# Altium footprint library Connectors.PcbLib: 97 footprints (part 5 of 7)
Each footprint in its own frame and in the unit in brackets; x right, y up, seen from the top. Pads: shape width x height; smd on the part's side, far side on the other; paste and mask are expansions set on the pad; w line width, h text height; cw(c..) or ccw(c..) is an arc to the next point about the centre after c.
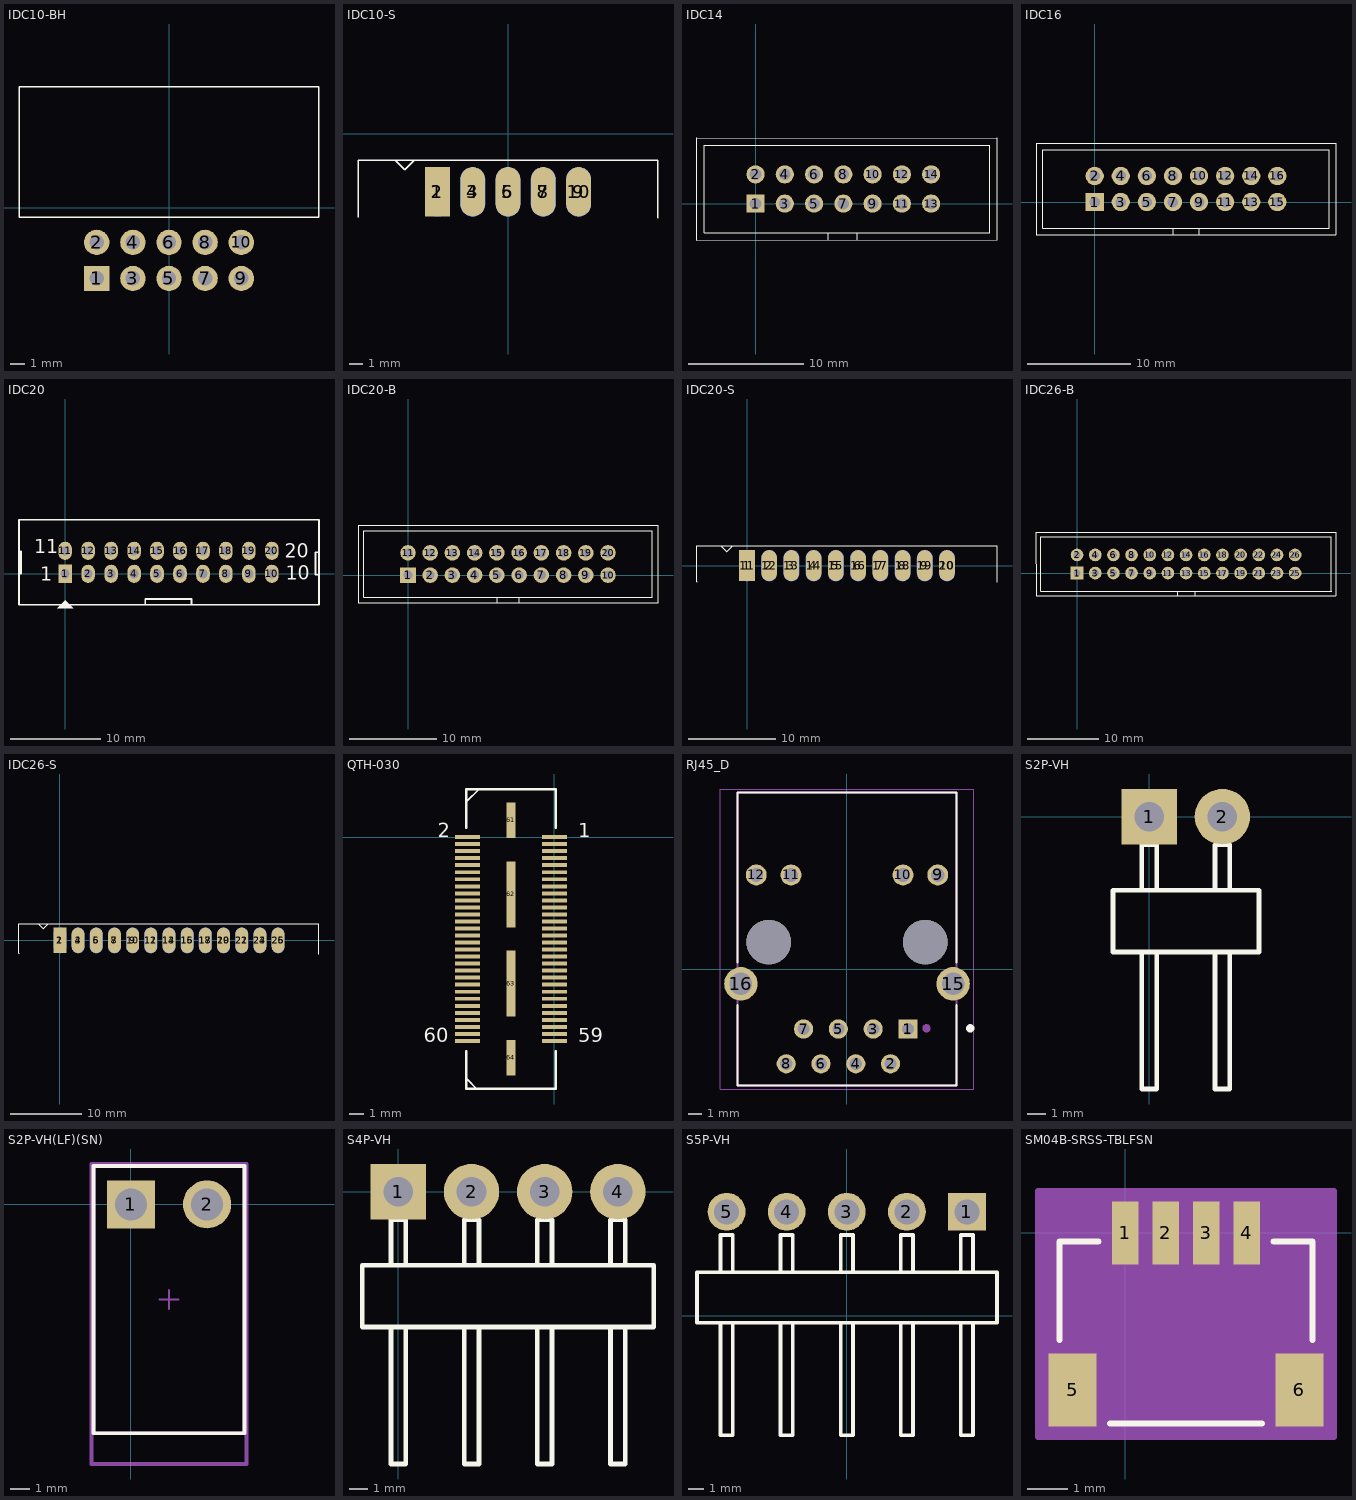
[diagram p4: the footprints below, top view; thin cyan lines are the x and y axes]

## IDC10-BH [mil]
pads (10):
  rect 70x70 hole 40: 1(-200,-195)
  round 70 hole 40: 2(-200,-95) 3(-100,-195) 4(-100,-95) 5(0,-195) 6(0,-95) 7(100,-195) 8(100,-95) 9(200,-195) 10(200,-95)
Top Overlay:
  lines w4: -415,-25 -415,335 415,335 415,-25 -415,-25
3D body "User Library-IDC Socket Male 10pin Angled THT Goldplated 2_54mm.step": height 353.54, standoff -93.31, extent -412.2,-203.86 412.2,330

## IDC10-S [mil]
pads (10):
  rect 70x140 smd: 1(-200,-165)
  oval 70x140 smd far side: 2(-200,-165) 4(-100,-165) 6(0,-165) 8(100,-165) 10(200,-165)
  oval 70x140 smd: 3(-100,-165) 5(0,-165) 7(100,-165) 9(200,-165)
Top Overlay:
  lines w4: -319,-75 -292,-102 -265,-75 ; -425,-237 -425,-75 425,-75 425,-239 ; -425,-237 -425,-237 ; 425,-239 425,-239
3D body: height 150, standoff -150, extent -424.5,-67.5 425,18
3D body: height 150, standoff 120, extent -425.5,-67.5 425.5,275.5
3D body: height 150, standoff -150, extent -424.5,-67.5 -386,276
3D body: height 150, standoff -150, extent -424.5,-67.5 425,18
3D body: height 150, standoff -150, extent 386.5,-67.5 425,276
3D body: height 150, standoff 120, extent -424.5,-67.5 425,276
3D body: height 30, standoff 10, extent 187.5,-237.5 212.5,236.5
3D body: height 30, standoff 10, extent 87.5,-237.5 112.5,236.5
3D body: height 30, standoff 10, extent -12.5,-237.5 12.5,236.5
3D body: height 30, standoff 10, extent -112.5,-237.5 -87.5,236.5
3D body: height 30, standoff 10, extent -212.5,-237.5 -187.5,236.5
3D body: height 30, standoff 10, extent -212.5,-237.5 -187.5,236.5
3D body: height 30, standoff 10, extent -112.5,-237.5 -87.5,236.5
3D body: height 30, standoff 10, extent -12.5,-237.5 12.5,236.5
3D body: height 30, standoff 10, extent 87.5,-237.5 112.5,236.5
3D body: height 30, standoff 10, extent 187.5,-237.5 212.5,236.5
3D body: height 151, standoff 150, extent -227.75,142 -175.25,257
3D body: height 150, standoff -150, extent 386.5,-67.5 425,276
3D body: height 150, standoff -150, extent -424.5,-67.5 -386,276

## IDC14 [mil]
pads (14):
  rect 62x62 hole 40: 1(0,0)
  round 62 hole 40: 2(0,100) 3(100,0) 4(100,100) 5(200,0) 6(200,100) 7(300,0) 8(300,100) 9(400,0) 10(400,100) 11(500,0) 12(500,100) 13(600,0) 14(600,100)
Top Overlay:
  lines w4: 248,-125 248,-100 ; 348,-125 348,-100 ; 824,224 -200,225 -200,-125 825,-124 ; 825,-125 825,225 ; -175,-100 -175,200 800,200 800,-100 300,-100 -175,-100
3D body: height 300, standoff -120, extent 587.5,87.5 612.5,112.5
3D body: height 300, standoff -120, extent 587.5,-12.5 612.5,12.5
3D body: height 300, standoff -120, extent 487.5,87.5 512.5,112.5
3D body: height 300, standoff -120, extent 487.5,-12.5 512.5,12.5
3D body: height 300, standoff -120, extent -12.5,-12.5 12.5,12.5
3D body: height 300, standoff -120, extent 87.5,-12.5 112.5,12.5
3D body: height 300, standoff -120, extent 187.5,-12.5 212.5,12.5
3D body: height 300, standoff -120, extent 287.5,-12.5 312.5,12.5
3D body: height 300, standoff -120, extent 387.5,-12.5 412.5,12.5
3D body: height 300, standoff -120, extent 387.5,87.5 412.5,112.5
3D body: height 300, standoff -120, extent 287.5,87.5 312.5,112.5
3D body: height 300, standoff -120, extent 187.5,87.5 212.5,112.5
3D body: height 300, standoff -120, extent 87.5,87.5 112.5,112.5
3D body: height 300, standoff -120, extent -12.5,87.5 12.5,112.5
3D body: height 102.36, standoff 0, extent -200.5,-125 825,225
3D body: height 358.27, standoff 0, extent -201.5,-125 824.5,225

## IDC16 [mil]
pads (16):
  rect 70x70 hole 40: 1(0,0)
  round 70 hole 40: 2(0,100) 3(100,0) 4(100,100) 5(200,0) 6(200,100) 7(300,0) 8(300,100) 9(400,0) 10(400,100) 11(500,0) 12(500,100) 13(600,0) 14(600,100) 15(700,0) 16(700,100)
Top Overlay:
  lines w4: 300,-125 300,-100 ; 400,-125 400,-100 ; -225,-125 -225,225 925,225 925,-125 -225,-125 ; -200,-100 900,-100 900,200 -200,200 -200,-100
3D body: height 300, standoff -120, extent 687.5,-12.5 712.5,12.5
3D body: height 300, standoff -120, extent 687.5,87.5 712.5,112.5
3D body: height 300, standoff -120, extent 587.5,87.5 612.5,112.5
3D body: height 300, standoff -120, extent 587.5,-12.5 612.5,12.5
3D body: height 300, standoff -120, extent 487.5,87.5 512.5,112.5
3D body: height 300, standoff -120, extent 487.5,-12.5 512.5,12.5
3D body: height 300, standoff -120, extent -12.5,-12.5 12.5,12.5
3D body: height 300, standoff -120, extent 87.5,-12.5 112.5,12.5
3D body: height 300, standoff -120, extent 187.5,-12.5 212.5,12.5
3D body: height 300, standoff -120, extent 287.5,-12.5 312.5,12.5
3D body: height 300, standoff -120, extent 387.5,-12.5 412.5,12.5
3D body: height 300, standoff -120, extent 387.5,87.5 412.5,112.5
3D body: height 300, standoff -120, extent 287.5,87.5 312.5,112.5
3D body: height 300, standoff -120, extent 187.5,87.5 212.5,112.5
3D body: height 300, standoff -120, extent 87.5,87.5 112.5,112.5
3D body: height 300, standoff -120, extent -12.5,87.5 12.5,112.5
3D body: height 102.36, standoff 0, extent -225,-125 924.5,225
3D body: height 358.27, standoff 0, extent -224.5,-125 925.5,225

## IDC20 [mm] "Header 10x2,20 pin, connecter"
height 7.62
pads (20):
  rect 1.5x2 hole 1: 1(0,0)
  oval 1.5x2 hole 1: 2(2.54,0) 3(5.08,0) 4(7.62,0) 5(10.16,0) 6(12.7,0) 7(15.24,0) 8(17.78,0) 9(20.32,0) 10(22.86,0) 11(0,2.54) 12(2.54,2.54) 13(5.08,2.54) 14(7.62,2.54) 15(10.16,2.54) 16(12.7,2.54) 17(15.24,2.54) 18(17.78,2.54) 19(20.32,2.54) 20(22.86,2.54)
Top Overlay:
  region: 0,-2.921 -0.889,-3.81 0.889,-3.81
  lines w0.178: -5.1,-0.025 -5.075,0 -4.875,0 -4.875,2.475 -5.1,2.475 ; 8.875,-3.394 8.875,-2.794 13.975,-2.794 13.975,-3.344 14.025,-3.394 ; 27.94,-0.127 27.686,-0.127 27.686,2.398 27.94,2.398 ; -5.1,-3.429 28.067,-3.429 28.067,5.969 -5.1,5.969 -5.1,-3.429
  text "20" at 24.257,1.778 h1.52
  text "10" at 24.384,-0.635 h1.52
  text "11" at -3.429,2.286 h1.52
  text "1" at -2.775,-0.75 h1.52
3D body "20 vuong.step": height 9.1, standoff -3, extent -5.094,-3.407 28.106,5.893

## IDC20-B [mil]
pads (20):
  rect 70x70 hole 40: 1(0,0)
  round 70 hole 40: 2(100,0) 3(200,0) 4(300,0) 5(400,0) 6(500,0) 7(600,0) 8(700,0) 9(800,0) 10(900,0) 11(0,100) 12(100,100) 13(200,100) 14(300,100) 15(400,100) 16(500,100) 17(600,100) 18(700,100) 19(800,100) 20(900,100)
Top Overlay:
  lines w4: 150,-100 1100,-100 1100,200 -200,200 -200,-100 250,-100 ; 400,-125 400,-100 ; 500,-125 500,-100 ; -225,-125 1125,-125 1125,225 -225,225 -225,-125
3D body: height 358.27, standoff 0, extent -224.5,-125 1125,225
3D body: height 102.36, standoff 0, extent -225,-125 1124.5,225
3D body: height 300, standoff -120, extent -12.5,87.5 12.5,112.5
3D body: height 300, standoff -120, extent 87.5,87.5 112.5,112.5
3D body: height 300, standoff -120, extent 187.5,87.5 212.5,112.5
3D body: height 300, standoff -120, extent 287.5,87.5 312.5,112.5
3D body: height 300, standoff -120, extent 387.5,87.5 412.5,112.5
3D body: height 300, standoff -120, extent 387.5,-12.5 412.5,12.5
3D body: height 300, standoff -120, extent 287.5,-12.5 312.5,12.5
3D body: height 300, standoff -120, extent 187.5,-12.5 212.5,12.5
3D body: height 300, standoff -120, extent 87.5,-12.5 112.5,12.5
3D body: height 300, standoff -120, extent -12.5,-12.5 12.5,12.5
3D body: height 300, standoff -120, extent 487.5,-12.5 512.5,12.5
3D body: height 300, standoff -120, extent 487.5,87.5 512.5,112.5
3D body: height 300, standoff -120, extent 587.5,-12.5 612.5,12.5
3D body: height 300, standoff -120, extent 587.5,87.5 612.5,112.5
3D body: height 300, standoff -120, extent 687.5,87.5 712.5,112.5
3D body: height 300, standoff -120, extent 687.5,-12.5 712.5,12.5
3D body: height 300, standoff -120, extent 787.5,-12.5 812.5,12.5
3D body: height 300, standoff -120, extent 787.5,87.5 812.5,112.5
3D body: height 300, standoff -120, extent 887.5,-12.5 912.5,12.5
3D body: height 300, standoff -120, extent 887.5,87.5 912.5,112.5

## IDC20-S [mil] "IDC20 EDGE SOLDERED"
pads (20):
  rect 70x140 smd: 1(0,0)
  oval 70x140 smd: 2(100,0) 3(200,0) 4(300,0) 5(400,0) 6(500,0) 7(600,0) 8(700,0) 9(800,0) 10(900,0)
  oval 70x140 smd far side: 11(0,0) 12(100,0) 13(200,0) 14(300,0) 15(400,0) 16(500,0) 17(600,0) 18(700,0) 19(800,0) 20(900,0)
Top Overlay:
  lines w4: -119,90 -92,63 -65,90 ; 1125,-75 1125,90 -225,90 -225,-72 ; -225,-72 -225,-72
3D body: height 30, standoff 10, extent 587.5,-72.5 612.5,401.5
3D body: height 30, standoff 10, extent 487.5,-72.5 512.5,401.5
3D body: height 30, standoff 10, extent 487.5,-72.5 512.5,401.5
3D body: height 30, standoff 10, extent 587.5,-72.5 612.5,401.5
3D body: height 150, standoff 120, extent -225.5,97.5 1125,440.5
3D body: height 150, standoff -150, extent -224.5,97.5 -186,441
3D body: height 150, standoff -150, extent -224.5,97.5 1125,183
3D body: height 150, standoff 120, extent -224.5,97.5 1125,441
3D body: height 30, standoff 10, extent 387.5,-72.5 412.5,401.5
3D body: height 30, standoff 10, extent 287.5,-72.5 312.5,401.5
3D body: height 30, standoff 10, extent 187.5,-72.5 212.5,401.5
3D body: height 30, standoff 10, extent 87.5,-72.5 112.5,401.5
3D body: height 30, standoff 10, extent -12.5,-72.5 12.5,401.5
3D body: height 30, standoff 10, extent -12.5,-72.5 12.5,401.5
3D body: height 30, standoff 10, extent 87.5,-72.5 112.5,401.5
3D body: height 30, standoff 10, extent 187.5,-72.5 212.5,401.5
3D body: height 30, standoff 10, extent 287.5,-72.5 312.5,401.5
3D body: height 30, standoff 10, extent 387.5,-72.5 412.5,401.5
3D body: height 151, standoff 150, extent -27.75,307 24.75,422
3D body: height 150, standoff -150, extent -224.5,97.5 -186,441
3D body: height 150, standoff -150, extent -224.5,97.5 1125,183
3D body: height 150, standoff -150, extent 1086.5,97.5 1125,441
3D body: height 30, standoff 10, extent 687.5,-72.5 712.5,401.5
3D body: height 30, standoff 10, extent 687.5,-72.5 712.5,401.5
3D body: height 150, standoff -150, extent 1086.5,97.5 1125,441
3D body: height 30, standoff 10, extent 887.5,-72.5 912.5,401.5
3D body: height 30, standoff 10, extent 787.5,-72.5 812.5,401.5
3D body: height 30, standoff 10, extent 787.5,-72.5 812.5,401.5
3D body: height 30, standoff 10, extent 887.5,-72.5 912.5,401.5

## IDC26-B [mil]
pads (26):
  rect 70x70 hole 40: 1(0,0)
  round 70 hole 40: 2(0,100) 3(100,0) 4(100,100) 5(200,0) 6(200,100) 7(300,0) 8(300,100) 9(400,0) 10(400,100) 11(500,0) 12(500,100) 13(600,0) 14(600,100) 15(700,0) 16(700,100) 17(800,0) 18(800,100) 19(900,0) 20(900,100) 21(1000,0) 22(1000,100) 23(1100,0) 24(1100,100) 25(1200,0) 26(1200,100)
Top Overlay:
  lines w4: 150,-100 1400.39,-100 ; 250,-100 -200,-100 -200,200 1399.41,200 ; 550.2,-125 550.2,-100 ; 650.2,-125 650.2,-100 ; 1400,-100 1400,200 ; 1424.41,-125 -225,-125 -225.98,225 1424.41,225 ; 1425,-125 1425,225
3D body: height 300, standoff -120, extent 887.5,87.5 912.5,112.5
3D body: height 300, standoff -120, extent 887.5,-12.5 912.5,12.5
3D body: height 300, standoff -120, extent 787.5,87.5 812.5,112.5
3D body: height 300, standoff -120, extent 787.5,-12.5 812.5,12.5
3D body: height 300, standoff -120, extent 687.5,-12.5 712.5,12.5
3D body: height 300, standoff -120, extent 687.5,87.5 712.5,112.5
3D body: height 300, standoff -120, extent 587.5,87.5 612.5,112.5
3D body: height 300, standoff -120, extent 587.5,-12.5 612.5,12.5
3D body: height 300, standoff -120, extent 487.5,87.5 512.5,112.5
3D body: height 300, standoff -120, extent 487.5,-12.5 512.5,12.5
3D body: height 300, standoff -120, extent -12.5,-12.5 12.5,12.5
3D body: height 300, standoff -120, extent 87.5,-12.5 112.5,12.5
3D body: height 300, standoff -120, extent 187.5,-12.5 212.5,12.5
3D body: height 300, standoff -120, extent 287.5,-12.5 312.5,12.5
3D body: height 300, standoff -120, extent 387.5,-12.5 412.5,12.5
3D body: height 300, standoff -120, extent 387.5,87.5 412.5,112.5
3D body: height 300, standoff -120, extent 287.5,87.5 312.5,112.5
3D body: height 300, standoff -120, extent 187.5,87.5 212.5,112.5
3D body: height 300, standoff -120, extent 87.5,87.5 112.5,112.5
3D body: height 300, standoff -120, extent -12.5,87.5 12.5,112.5
3D body: height 102.36, standoff 0, extent -225,-125 1425,225
3D body: height 358.27, standoff 0, extent -224.5,-125 1425,225
3D body: height 300, standoff -120, extent 987.5,-12.5 1012.5,12.5
3D body: height 300, standoff -120, extent 987.5,87.5 1012.5,112.5
3D body: height 300, standoff -120, extent 1087.5,-12.5 1112.5,12.5
3D body: height 300, standoff -120, extent 1087.5,87.5 1112.5,112.5
3D body: height 300, standoff -120, extent 1187.5,-12.5 1212.5,12.5
3D body: height 300, standoff -120, extent 1187.5,87.5 1212.5,112.5

## IDC26-S [mil] "IDC26 EDGE SOLDERED"
pads (26):
  rect 70x140 smd: 1(0,0)
  oval 70x140 smd far side: 2(0,0) 4(100,0) 6(200,0) 8(300,0) 10(400,0) 12(500,0) 14(600,0) 16(700,0) 18(800,0) 20(900,0) 22(1000,0) 24(1100,0) 26(1200,0)
  oval 70x140 smd: 3(100,0) 5(200,0) 7(300,0) 9(400,0) 11(500,0) 13(600,0) 15(700,0) 17(800,0) 19(900,0) 21(1000,0) 23(1100,0) 25(1200,0)
Top Overlay:
  lines w4: -119,90 -92,63 -65,90 ; 1425,-75 1425,90 -225,90 -225,-72 ; -225,-72 -225,-72
3D body: height 30, standoff 10, extent 887.5,-72.5 912.5,401.5
3D body: height 30, standoff 10, extent 787.5,-72.5 812.5,401.5
3D body: height 30, standoff 10, extent 787.5,-72.5 812.5,401.5
3D body: height 30, standoff 10, extent 887.5,-72.5 912.5,401.5
3D body: height 30, standoff 10, extent 687.5,-72.5 712.5,401.5
3D body: height 30, standoff 10, extent 687.5,-72.5 712.5,401.5
3D body: height 150, standoff -150, extent -224.5,97.5 1425,183
3D body: height 150, standoff -150, extent -224.5,97.5 -186,441
3D body: height 151, standoff 150, extent -27.75,307 24.75,422
3D body: height 30, standoff 10, extent 387.5,-72.5 412.5,401.5
3D body: height 30, standoff 10, extent 287.5,-72.5 312.5,401.5
3D body: height 30, standoff 10, extent 187.5,-72.5 212.5,401.5
3D body: height 30, standoff 10, extent 87.5,-72.5 112.5,401.5
3D body: height 30, standoff 10, extent -12.5,-72.5 12.5,401.5
3D body: height 30, standoff 10, extent -12.5,-72.5 12.5,401.5
3D body: height 30, standoff 10, extent 87.5,-72.5 112.5,401.5
3D body: height 30, standoff 10, extent 187.5,-72.5 212.5,401.5
3D body: height 30, standoff 10, extent 287.5,-72.5 312.5,401.5
3D body: height 30, standoff 10, extent 387.5,-72.5 412.5,401.5
3D body: height 150, standoff 120, extent -224.5,97.5 1425,441
3D body: height 150, standoff -150, extent -224.5,97.5 1425,183
3D body: height 150, standoff -150, extent -224.5,97.5 -186,441
3D body: height 150, standoff 120, extent -225.5,97.5 1425,440.5
3D body: height 30, standoff 10, extent 587.5,-72.5 612.5,401.5
3D body: height 30, standoff 10, extent 487.5,-72.5 512.5,401.5
3D body: height 30, standoff 10, extent 487.5,-72.5 512.5,401.5
3D body: height 30, standoff 10, extent 587.5,-72.5 612.5,401.5
3D body: height 150, standoff -150, extent 1386.5,97.5 1425,441
3D body: height 30, standoff 10, extent 987.5,-72.5 1012.5,401.5
3D body: height 30, standoff 10, extent 987.5,-72.5 1012.5,401.5
3D body: height 150, standoff -150, extent 1386.5,97.5 1425,441
3D body: height 30, standoff 10, extent 1187.5,-72.5 1212.5,401.5
3D body: height 30, standoff 10, extent 1087.5,-72.5 1112.5,401.5
3D body: height 30, standoff 10, extent 1087.5,-72.5 1112.5,401.5
3D body: height 30, standoff 10, extent 1187.5,-72.5 1212.5,401.5

## QTH-030 [mil]
pads (64):
  rect 70x11 smd: 1(0,0) 2(-243,0) 3(0,-19.7) 4(-243,-19.7) 5(0,-39.4) 6(-243,-39.4) 7(0,-59) 8(-243,-59) 9(0,-78.7) 10(-243,-78.7) 11(0,-98.4) 12(-243,-98.4) 13(0,-118.1) 14(-243,-118.1) 15(0,-137.8) 16(-243,-137.8) 17(0,-157.5) 18(-243,-157.5) 19(0,-177.1) 20(-243,-177.1) 21(0,-196.8) 22(-243,-196.8) 23(0,-216.4) 24(-243,-216.4) 25(0,-236.2) 26(-243,-236.2) 27(0,-255.9) 28(-243,-255.9) 29(0,-275.6) 30(-243,-275.6) 31(0,-295.2) 32(-243,-295.2) 33(0,-314.9) 34(-243,-314.9) 35(0,-334.6) 36(-243,-334.6) 37(0,-354.4) 38(-243,-354.4) 39(0,-374) 40(-243,-374) 41(0,-393.7) 42(-243,-393.7) 43(0,-413.3) 44(-243,-413.3) 45(0,-433) 46(-243,-433) 47(0,-452.7) 48(-243,-452.7) 49(0,-472.4) 50(-243,-472.4) 51(0,-492.1) 52(-243,-492.1) 53(0,-511.8) 54(-243,-511.8) 55(0,-531.4) 56(-243,-531.4) 57(0,-551.1) 58(-243,-551.1) 59(0,-570.8) 60(-243,-570.8)
  rect 25x100 smd: 61(-121.5,47.1) 64(-121.5,-617.9)
  rect 25x185 smd: 62(-121.5,-160.4) 63(-121.5,-410.4)
Top Overlay:
  lines w5: -246.5,-677.17 -244.77,-677.17 -216.54,-705.4 ; -246.5,98.43 -210.33,134.6 -208.66,134.6
  lines w7: -246.5,-600.4 -246.5,-705.4 3.5,-705.4 3.5,-600.4 ; -246.5,25.5 -246.5,134.6 3.5,134.6 3.5,25.5
  text "1" at 66.93,0 h40
  text "2" at -326.77,0 h40
  text "60" at -366.14,-574.8 h40
  text "59" at 66.93,-574.8 h40
3D body "QTH-030-01-X-D-A.step": height 167.88, standoff -29.13, extent -260,-678.75 20,108.75

## RJ45_D [mm]
pads (16):
  rect 1.398x1.398 / inner round 1.398 / far side rect 1.398x1.398 hole 0.89: 1(4.45,-4.355)
  round 1.398 hole 0.89: 2(3.18,-6.895) 3(1.91,-4.355) 4(0.64,-6.895) 5(-0.63,-4.355) 6(-1.9,-6.895) 7(-3.17,-4.355) 8(-4.44,-6.895)
  round 1.53 hole 1.02: 9(6.625,6.895) 10(4.085,6.895) 11(-4.085,6.895) 12(-6.625,6.895)
  round 2.445 hole 1.63: 15(7.745,-1.055) 16(-7.745,-1.055)
  round 3.25 hole 3.25 unplated: ""(-5.715,1.995) ""(5.715,1.995)
Top Overlay:
  circle w0.3: c9,-4.305 r0.15
  lines w0.127: -8,-2.605 -8,-8.485 8,-8.485 8,-2.605 ; -8,0.495 -8,12.915 8,12.915 8,0.495
Mechanical 13:
  circle w0.3: c5.8,-4.305 r0.15
  lines w0.127: -8,-8.485 8,-8.485 8,12.915 -8,12.915 -8,-8.485
Mechanical 15:
  lines w0.05: -9.25,-8.735 9.25,-8.735 9.25,13.165 -9.25,13.165 -9.25,-8.735
3D body "step_temp.STEP": height 13.5, standoff -3.05, extent -8.02,-8.385 8.02,12.915

## S2P-VH [mm]
pads (2):
  rect 3x3 hole 1.6: 1(0,0)
  round 3 hole 1.6: 2(3.96,0)
Top Overlay:
  lines w0.254: -1.956,-7.315 5.934,-7.315 5.934,-3.986 -1.956,-3.986 -1.956,-7.315 ; -0.4,-14.732 -0.4,-7.315 0.4,-7.315 0.4,-14.732 -0.4,-14.732 ; -0.4,-3.986 -0.4,-1.524 0.4,-1.524 0.4,-3.986 -0.4,-3.986 ; 3.56,-14.732 3.56,-7.315 4.36,-7.315 4.36,-14.732 3.56,-14.732 ; 3.56,-3.986 3.56,-1.524 4.36,-1.524 4.36,-3.986 3.56,-3.986
3D body "User Library-B2PS-VH.STEP": height 8.75, standoff -3.65, extent -1.956,-14.886 5.904,0.584

## S2P-VH(LF)(SN) [mm] "CONN HEADER R/A 2POS 3.96MM"
pads (2):
  rect 2.5x2.5 hole 1.65 paste-2539.97 mask+0: 1(0,0)
  round 2.5 hole 1.65 paste-2539.97 mask+0: 2(3.96,0)
Top Overlay:
  lines w0.2: -1.95,-11.9 -1.95,2 5.91,2 5.91,-11.9 -1.95,-11.9
Top Courtyard:
  lines w0.2: -2.05,-13.5 -2.05,2.1 6.01,2.1 6.01,-13.5 -2.05,-13.5
Top 3D Body:
  lines w0.2: -1.95,-11.9 -1.95,2 5.91,2 5.91,-11.9 -1.95,-11.9
Top Assembly:
  lines w0.2: -2.05,-13.5 -2.05,2.1 6.01,2.1 6.01,-13.5 -2.05,-13.5
Top Component Center:
  lines w0.1: 1.48,-4.95 2.48,-4.95 ; 1.98,-5.45 1.98,-4.45
3D body "Conn_JST_S2P-VH_LF_SN_eec.STEP": height 8.5, standoff -3.6, extent -1.951,-13.4 5.911,2

## S4P-VH [mm]
pads (4):
  rect 3x3 hole 1.6: 1(0,0)
  round 3 hole 1.6: 2(3.96,0) 3(7.92,0) 4(11.88,0)
Top Overlay:
  lines w0.254: -1.956,-7.315 13.824,-7.315 13.824,-3.986 -1.956,-3.986 -1.956,-7.315 ; -0.4,-14.732 0.4,-14.732 0.4,-7.315 -0.4,-7.315 -0.4,-14.732 ; -0.4,-3.986 0.4,-3.986 0.4,-1.524 -0.4,-1.524 -0.4,-3.986 ; 3.56,-14.732 4.36,-14.732 4.36,-7.315 3.56,-7.315 3.56,-14.732 ; 3.56,-3.986 4.36,-3.986 4.36,-1.524 3.56,-1.524 3.56,-3.986 ; 7.52,-14.732 8.32,-14.732 8.32,-7.315 7.52,-7.315 7.52,-14.732 ; 7.52,-3.986 8.32,-3.986 8.32,-1.524 7.52,-1.524 7.52,-3.986 ; 11.48,-14.732 12.28,-14.732 12.28,-7.315 11.48,-7.315 11.48,-14.732 ; 11.48,-3.986 12.28,-3.986 12.28,-1.524 11.48,-1.524 11.48,-3.986
3D body "User Library-B4PS-VH.STEP": height 8.75, standoff -3.65, extent -1.956,-14.886 13.824,0.584

## S5P-VH [mm]
pads (5):
  rect 2.5x2.5 hole 1.65: 1(7.92,6.858)
  round 2.5 hole 1.65: 2(3.96,6.858) 3(0,6.858) 4(-3.96,6.858) 5(-7.92,6.858)
Top Overlay:
  lines w0.254: -9.876,-0.457 9.906,-0.457 9.906,2.872 -9.876,2.872 -9.876,-0.457 ; -8.32,-7.874 -8.32,-0.457 -7.52,-0.457 -7.52,-7.874 -8.32,-7.874 ; -8.32,2.872 -7.52,2.872 -7.52,5.334 -8.32,5.334 -8.32,2.872 ; -4.36,-7.874 -4.36,-0.457 -3.56,-0.457 -3.56,-7.874 -4.36,-7.874 ; -4.36,2.872 -3.56,2.872 -3.56,5.334 -4.36,5.334 -4.36,2.872 ; -0.4,-7.874 -0.4,-0.457 0.4,-0.457 0.4,-7.874 -0.4,-7.874 ; -0.4,2.872 0.4,2.872 0.4,5.334 -0.4,5.334 -0.4,2.872 ; 3.56,-7.874 3.56,-0.457 4.36,-0.457 4.36,-7.874 3.56,-7.874 ; 3.56,2.872 3.56,5.334 4.36,5.334 4.36,2.872 3.56,2.872 ; 7.52,-7.874 7.52,-0.457 8.32,-0.457 8.32,-7.874 7.52,-7.874 ; 7.52,2.872 7.52,5.334 8.32,5.334 8.32,2.872 7.52,2.872
3D body "B5PS-VH.stp": height 8.5, standoff -3.6, extent -9.86,-8.042 9.88,7.428

## SM04B-SRSS-TBLFSN [mil] "CONN HEADER SMD R/A 4POS 1MM / PN: SM04B-SRSS-TB"
pads (6):
  rect 26x61 smd paste+0 mask+0: 1(0,0) 2(39.37,0) 3(78.74,0) 4(118.11,0)
  rect 47x71 smd paste+0 mask+0: 5(-51.18,-152.56) 6(169.29,-152.56)
Top Overlay:
  lines w6: -63.94,-103.96 -63.94,-8.19 -26.1,-8.19 ; -14.58,-185.19 132.69,-185.19 ; 144.21,-8.19 182.06,-8.19 182.06,-103.96
Mechanical 13:
  lines w1: -58.94,-180.19 177.06,-180.19 177.06,-13.19 -58.94,-13.19 -58.94,-180.19
Mechanical 15:
  region: 202.79,40.5 -84.68,40.5 -84.68,-198.06 202.79,-198.06
  lines w6: -84.68,-198.06 -84.68,40.5 202.79,40.5 202.79,-198.06 -84.68,-198.06
3D body "SM04B-SRSS-TB_LF__SN_.stp": height 128.15, standoff 11.61, extent -59.96,-183.72 176.26,11.13